# Altium footprint library Pcblib.PcbLib: 281 footprints (part 9 of 18)
Each footprint in its own frame and in the unit in brackets; x right, y up, seen from the top. Pads: shape width x height; smd on the part's side, far side on the other; paste and mask are expansions set on the pad; w line width, h text height; cw(c..) or ccw(c..) is an arc to the next point about the centre after c.
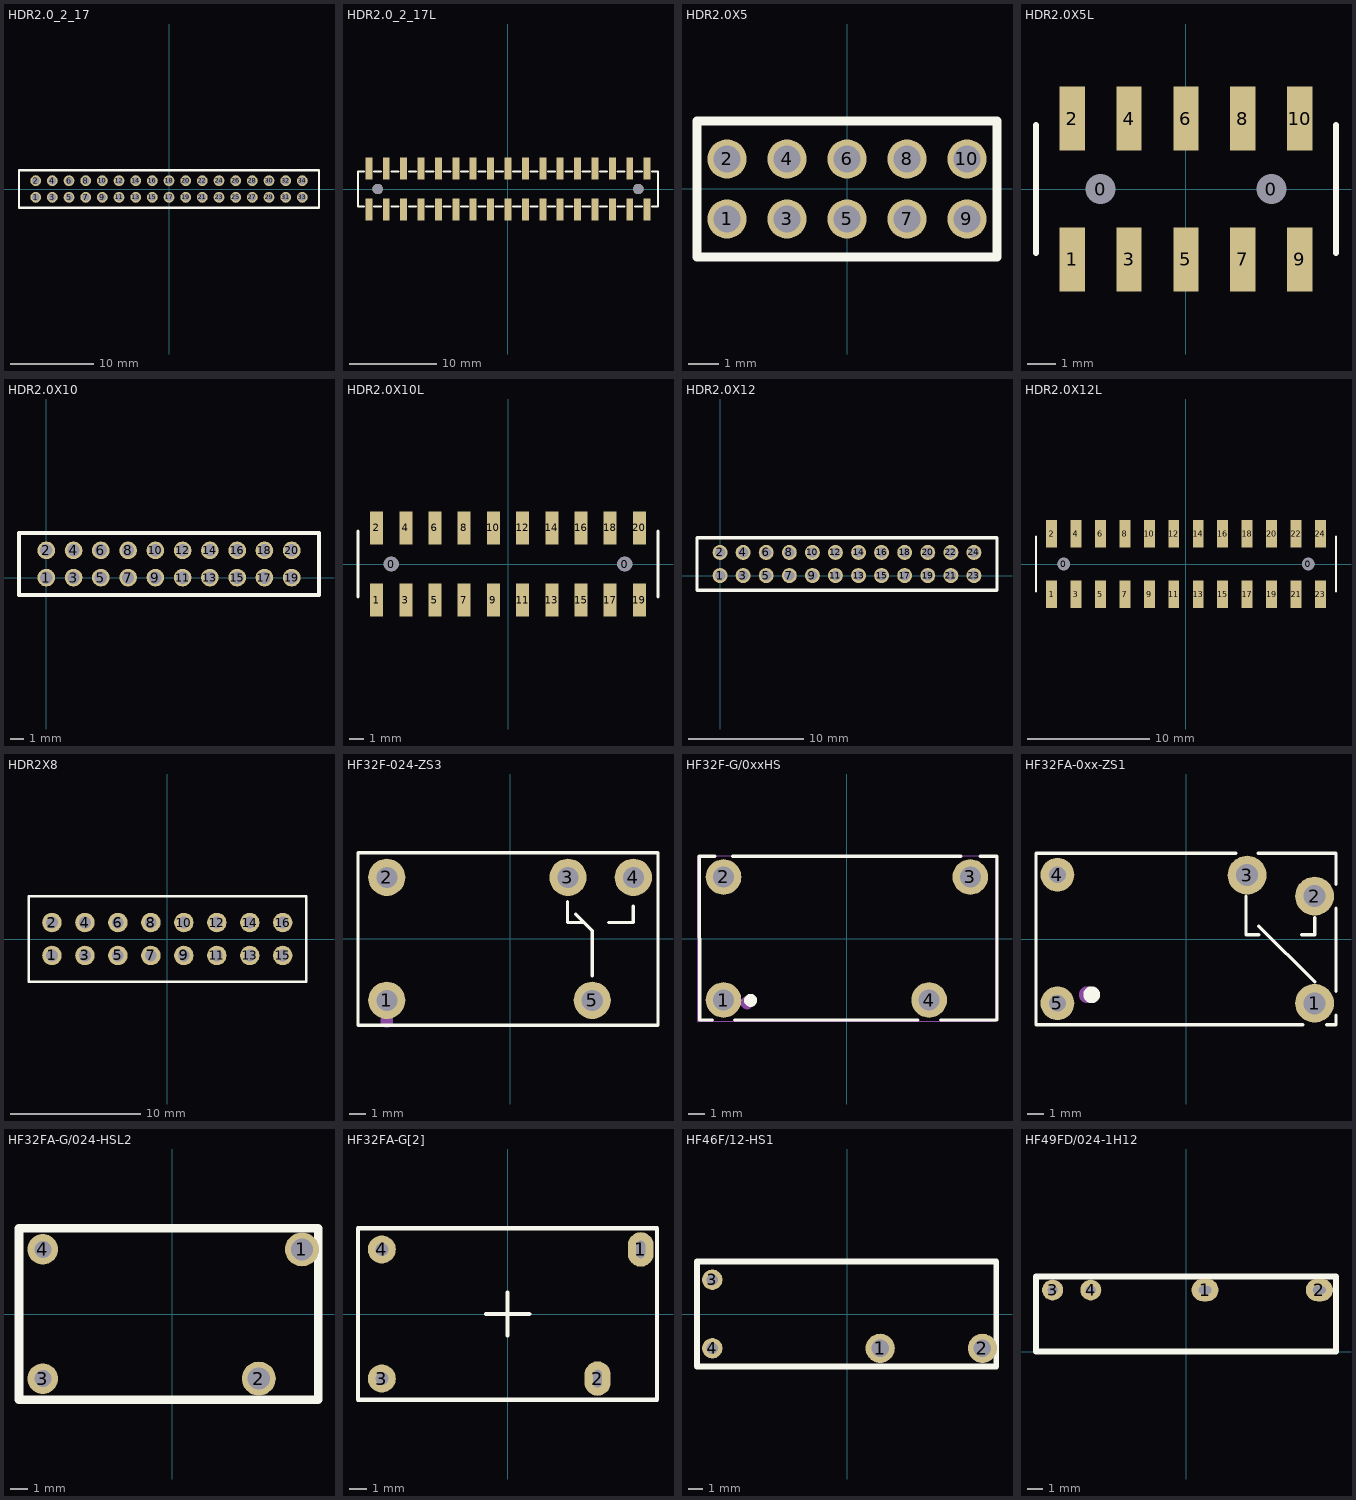
[diagram p8: the footprints below, top view; thin cyan lines are the x and y axes]

## HDR2.0_2_17 [mm] "Connector; Header; 7x2 Position"
pads (34):
  round 1.3 hole 0.9: 1(-16,-1) 2(-16,1) 3(-14,-1) 4(-14,1) 5(-12,-1) 6(-12,1) 7(-10,-1) 8(-10,1) 9(-8,-1) 10(-8,1) 11(-6,-1) 12(-6,1) 13(-4,-1) 14(-4,1) 15(-2,-1) 16(-2,1) 17(0,-1) 18(0,1) 19(2,-1) 20(2,1) 21(4,-1) 22(4,1) 23(6,-1) 24(6,1) 25(8,-1) 26(8,1) 27(10,-1) 28(10,1) 29(12,-1) 30(12,1) 31(14,-1) 32(14,1) 33(16,-1) 34(16,1)
Top Overlay:
  lines w0.3: -18,-2.27 18,-2.27 18,2.27 -18,2.27 -18,-2.27

## HDR2.0_2_17L [mm]
pads (36):
  rect 0.8x2.5 smd: 1(-16,2.35) 2(-16,-2.35) 3(-14,2.35) 4(-14,-2.35) 5(-12,2.35) 6(-12,-2.35) 7(-10,2.35) 8(-10,-2.35) 9(-8,2.35) 10(-8,-2.35) 11(-6,2.35) 12(-6,-2.35) 13(-4,2.35) 14(-4,-2.35) 15(-2,2.35) 16(-2,-2.35) 17(0,2.35) 18(0,-2.35) 19(2,2.35) 20(2,-2.35) 21(4,2.35) 22(4,-2.35) 23(6,2.35) 24(6,-2.35) 25(8,2.35) 26(8,-2.35) 27(10,2.35) 28(10,-2.35) 29(12,2.35) 30(12,-2.35) 31(14,2.35) 32(14,-2.35) 33(16,2.35) 34(16,-2.35)
  round 1.2 hole 1.2 unplated: ""(-15,0) ""(15,0)
Top Overlay:
  lines w0.254: -16.6,-2 -17.25,-2 -17.25,2 -16.6,2 ; -15.4,-2 -14.6,-2 ; -15.4,2 -14.6,2 ; -13.4,-2 -12.6,-2 ; -13.4,2 -12.6,2 ; -11.4,-2 -10.6,-2 ; -11.4,2 -10.6,2 ; -9.4,-2 -8.6,-2 ; -9.4,2 -8.6,2 ; -7.4,-2 -6.6,-2 ; -7.4,2 -6.6,2 ; -5.4,-2 -4.6,-2 ; -5.4,2 -4.6,2 ; -3.4,-2 -2.6,-2 ; -3.4,2 -2.6,2 ; -1.4,-2 -0.6,-2 ; -1.4,2 -0.6,2 ; 0.6,-2 1.4,-2 ; 0.6,2 1.4,2 ; 2.6,-2 3.4,-2 ; 2.6,2 3.4,2 ; 4.6,-2 5.4,-2 ; 4.6,2 5.4,2 ; 6.6,-2 7.4,-2 ; 6.6,2 7.4,2 ; 8.6,-2 9.4,-2 ; 8.6,2 9.4,2 ; 10.6,-2 11.4,-2 ; 10.6,2 11.4,2 ; 12.6,-2 13.4,-2 ; 12.6,2 13.4,2 ; 14.6,-2 15.4,-2 ; 14.6,2 15.4,2 ; 16.6,-2 17.25,-2 17.25,2 16.6,2

## HDR2.0X5 [mm] "Connector; Header; 7x2 Position"
pads (10):
  round 1.3 hole 0.9: 1(-4,-1) 2(-4,1) 3(-2,-1) 4(-2,1) 5(0,-1) 6(0,1) 7(2,-1) 8(2,1) 9(4,-1) 10(4,1)
Top Overlay:
  lines w0.3: -5,-2.27 -5,2.27 5,2.27 5,-2.27 -5,-2.27

## HDR2.0X5L [mm]
pads (12):
  round 1 hole 1.05: 0(-3,0) 0(3,0)
  rect 0.89x2.25 smd: 1(-4,-2.475) 2(-4,2.475) 3(-2,-2.475) 4(-2,2.475) 5(0,-2.475) 6(0,2.475) 7(2,-2.475) 8(2,2.475) 9(4,-2.475) 10(4,2.475)
Top Overlay:
  lines w0.2: -5.27,-2.25 -5.27,2.25 ; 5.271,-2.25 5.271,2.25
3D body: height 0.53, standoff 0.02, extent -5.143,-2.413 5.271,2.437

## HDR2.0X10 [mm] "Connector; Header; 7x2 Position"
pads (20):
  round 1.3 hole 0.9: 1(0,0) 2(0,2) 3(2,0) 4(2,2) 5(4,0) 6(4,2) 7(6,0) 8(6,2) 9(8,0) 10(8,2) 11(10,0) 12(10,2) 13(12,0) 14(12,2) 15(14,0) 16(14,2) 17(16,0) 18(16,2) 19(18,0) 20(18,2)
Top Overlay:
  lines w0.3: -2,-1.27 20,-1.27 20,3.27 -2,3.27 -2,-1.27

## HDR2.0X10L [mm]
pads (22):
  round 1 hole 1.05: 0(-8,0) 0(8,0)
  rect 0.89x2.25 smd: 1(-9,-2.475) 2(-9,2.475) 3(-7,-2.475) 4(-7,2.475) 5(-5,-2.475) 6(-5,2.475) 7(-3,-2.475) 8(-3,2.475) 9(-1,-2.475) 10(-1,2.475) 11(1,-2.475) 12(1,2.475) 13(3,-2.475) 14(3,2.475) 15(5,-2.475) 16(5,2.475) 17(7,-2.475) 18(7,2.475) 19(9,-2.475) 20(9,2.475)
Top Overlay:
  lines w0.2: -10.27,-2.25 -10.27,2.25 ; 10.27,-2.25 10.27,2.25
3D body: height 0.53, standoff 0.02, extent -10.223,-2.438 10.223,2.412

## HDR2.0X12 [mm] "Connector; Header; 7x2 Position"
pads (24):
  round 1.3 hole 0.9: 1(0,0) 2(0,2) 3(2,0) 4(2,2) 5(4,0) 6(4,2) 7(6,0) 8(6,2) 9(8,0) 10(8,2) 11(10,0) 12(10,2) 13(12,0) 14(12,2) 15(14,0) 16(14,2) 17(16,0) 18(16,2) 19(18,0) 20(18,2) 21(20,0) 22(20,2) 23(22,0) 24(22,2)
Top Overlay:
  lines w0.3: -2,-1.27 -2,3.27 24,3.27 24,-1.27 -2,-1.27

## HDR2.0X12L [mm]
pads (26):
  round 1 hole 1.05: 0(-10,0) 0(10,0)
  rect 0.89x2.25 smd: 1(-11,-2.475) 2(-11,2.475) 3(-9,-2.475) 4(-9,2.475) 5(-7,-2.475) 6(-7,2.475) 7(-5,-2.475) 8(-5,2.475) 9(-3,-2.475) 10(-3,2.475) 11(-1,-2.475) 12(-1,2.475) 13(1,-2.475) 14(1,2.475) 15(3,-2.475) 16(3,2.475) 17(5,-2.475) 18(5,2.475) 19(7,-2.475) 20(7,2.475) 21(9,-2.475) 22(9,2.475) 23(11,-2.475) 24(11,2.475)
Top Overlay:
  lines w0.2: -12.27,-2.25 -12.27,2.25 ; 12.27,-2.25 12.27,2.25
3D body: height 0.53, standoff 0.02, extent -12.192,-2.489 12.192,2.488

## HDR2X8 [mm] "Connector; Header; 8x2 Position"
pads (16):
  round 1.5 hole 0.9: 1(-8.89,-1.27) 2(-8.89,1.27) 3(-6.35,-1.27) 4(-6.35,1.27) 5(-3.81,-1.27) 6(-3.81,1.27) 7(-1.27,-1.27) 8(-1.27,1.27) 9(1.27,-1.27) 10(1.27,1.27) 11(3.81,-1.27) 12(3.81,1.27) 13(6.35,-1.27) 14(6.35,1.27) 15(8.89,-1.27) 16(8.89,1.27)
Top Overlay:
  lines w0.2: -10.693,-3.302 10.707,-3.302 10.707,3.302 -10.693,3.302 -10.693,-3.302

## HF32F-024-ZS3 [mm]
pads (5):
  round 2.3 hole 1.3: 1(-7.62,-3.8) 2(-7.62,3.8) 3(3.58,3.8) 4(7.62,3.8) 5(5.08,-3.8)
Top Overlay:
  lines w0.2: 3.556,2.286 3.556,1.016 4.572,1.016 ; 4.064,1.524 5.08,0.508 5.08,-2.286 ; 6.096,1.016 7.62,1.016 7.62,2.032 ; 9.144,-5.09 9.144,5.07
  lines w0.203: 9.144,-5.09 9.144,-5.344 -9.398,-5.344 -9.398,5.324 9.144,5.324 9.144,5.07
Mechanical 15:
  circle w0.4: c-7.62,-5.08 r0.2

## HF32F-G/0xxHS [mm]
pads (4):
  round 2.2 hole 1.3 paste+0 mask+0.05: 1(-7.62,-3.8) 2(-7.62,3.8) 3(7.62,3.8) 4(5.08,-3.8)
Top Overlay:
  circle w0.4: c-5.95,-3.82 r0.2
  lines w0.2: -9.11,-5.04 -8.313,-5.03 ; -9.091,-5.03 -9.12,5.08 -8.17,5.08 ; -7.07,5.08 7.024,5.08 ; -6.927,-5.03 4.387,-5.03 ; 5.773,-5.03 9.27,-5.03 9.27,5.08 8.216,5.08
Mechanical 6:
  circle w0.4: c-6.17,-3.97 r0.2
Mechanical 15:
  region: -9.14,-5.1 -9.14,-5.075 -9.175,-5.04 -9.225,-5.04 -9.26,-5.075 -9.26,-5.1 -9.26,-5.125 -9.225,-5.16 -9.175,-5.16 -9.14,-5.125
  region: -7.845,-3.585 -7.395,-3.585 -7.395,-4.035 -7.845,-4.035
  region: -7.845,4.015 -7.395,4.015 -7.395,3.565 -7.845,3.565
  region: 7.47,4.2 7.77,4.2 7.77,3.4 7.47,3.4
  region: 4.93,-3.4 5.23,-3.4 5.23,-4.2 4.93,-4.2
  lines w0.051: -9.2,-5.1 -9.2,5.1 9.2,5.1 9.2,-5.1 -9.2,-5.1

## HF32FA-0xx-ZS1 [mm]
pads (5):
  round 2.3 hole 1.3: 1(7.62,-3.81) 2(7.62,2.54) 3(3.62,3.787)
  round 2 hole 1: 4(-7.62,3.81) 5(-7.62,-3.81)
Top Overlay:
  circle w0.5: c-5.588,-3.302 r0.25
  lines w0.2: 2.957,5.08 -8.636,5.08 -8.89,5.08 -8.89,-5.08 6.914,-5.08 ; 3.556,2.54 3.556,0.254 4.318,0.254 ; 4.283,5.08 8.636,5.08 8.89,5.08 8.89,3.246 ; 4.318,0.762 7.62,-2.54 ; 6.858,0.254 7.62,0.254 7.62,1.27 ; 8.326,-5.08 8.636,-5.08 8.89,-5.08 8.89,-4.516 ; 8.89,-3.104 8.89,1.834
Mechanical 15:
  circle w0.5: c-5.842,-3.302 r0.25

## HF32FA-G/024-HSL2 [mm]
pads (4):
  round 2 hole 1.3: 1(7.62,3.8) 2(5.08,-3.8)
  round 1.8 hole 1: 3(-7.62,-3.8) 4(-7.62,3.8)
Top Overlay:
  lines w0.508: -9.02,-5.05 -9.02,5.05 8.58,5.05 8.58,-5.05 -9.02,-5.05
3D body "HF32FA-G[2].stp": height 12.8, standoff -3.51, extent -9.02,-5.05 8.58,5.05

## HF32FA-G[2] [mil]
pads (4):
  oval 60x80 hole 20 slot 40 at 90 deg: 1(308.66,149.61) 2(208.66,-149.61)
  round 65 hole 30: 3(-291.34,-149.61) 4(-291.34,149.61)
Top Overlay:
  lines w10: -50,0 50,0 ; 0,-50 0,50 ; -346.46,-198.82 -346.46,198.82 346.46,198.82 346.46,-198.82 -346.46,-198.82
3D body "HF32FA-G[2].stp": height 500.57, standoff -141.53, extent -347.48,-198.82 345.43,198.82

## HF46F/12-HS1 [mm]
height 15.3
pads (4):
  round 2 hole 1.2: 1(2.25,-2.35) 2(9.25,-2.35)
  round 1.4 hole 0.8: 3(-9.25,2.35) 4(-9.25,-2.35)
Top Overlay:
  lines w0.4: -10.3,-3.6 10.2,-3.6 10.2,3.6 -10.3,3.6 -10.3,-3.6

## HF49FD/024-1H12 [mm]
height 15.3
pads (4):
  oval 1.8x1.5 hole 0.5 slot 0.85 at 0 deg: 1(1.27,4.1) 2(8.89,4.1)
  round 1.4 hole 0.5 slot 0.65 at 0 deg: 3(-8.89,4.1) 4(-6.35,4.1)
Top Overlay:
  lines w0.4: -10,0 -10,5 10,5 10,0 -10,0
3D body "HF49FD[2].stp": height 12.5, standoff -3.5, extent -10,0 10,5